# Altium schematic symbol library Regulator_Switching.SchLib: 1070 symbols (part 4 of 9)
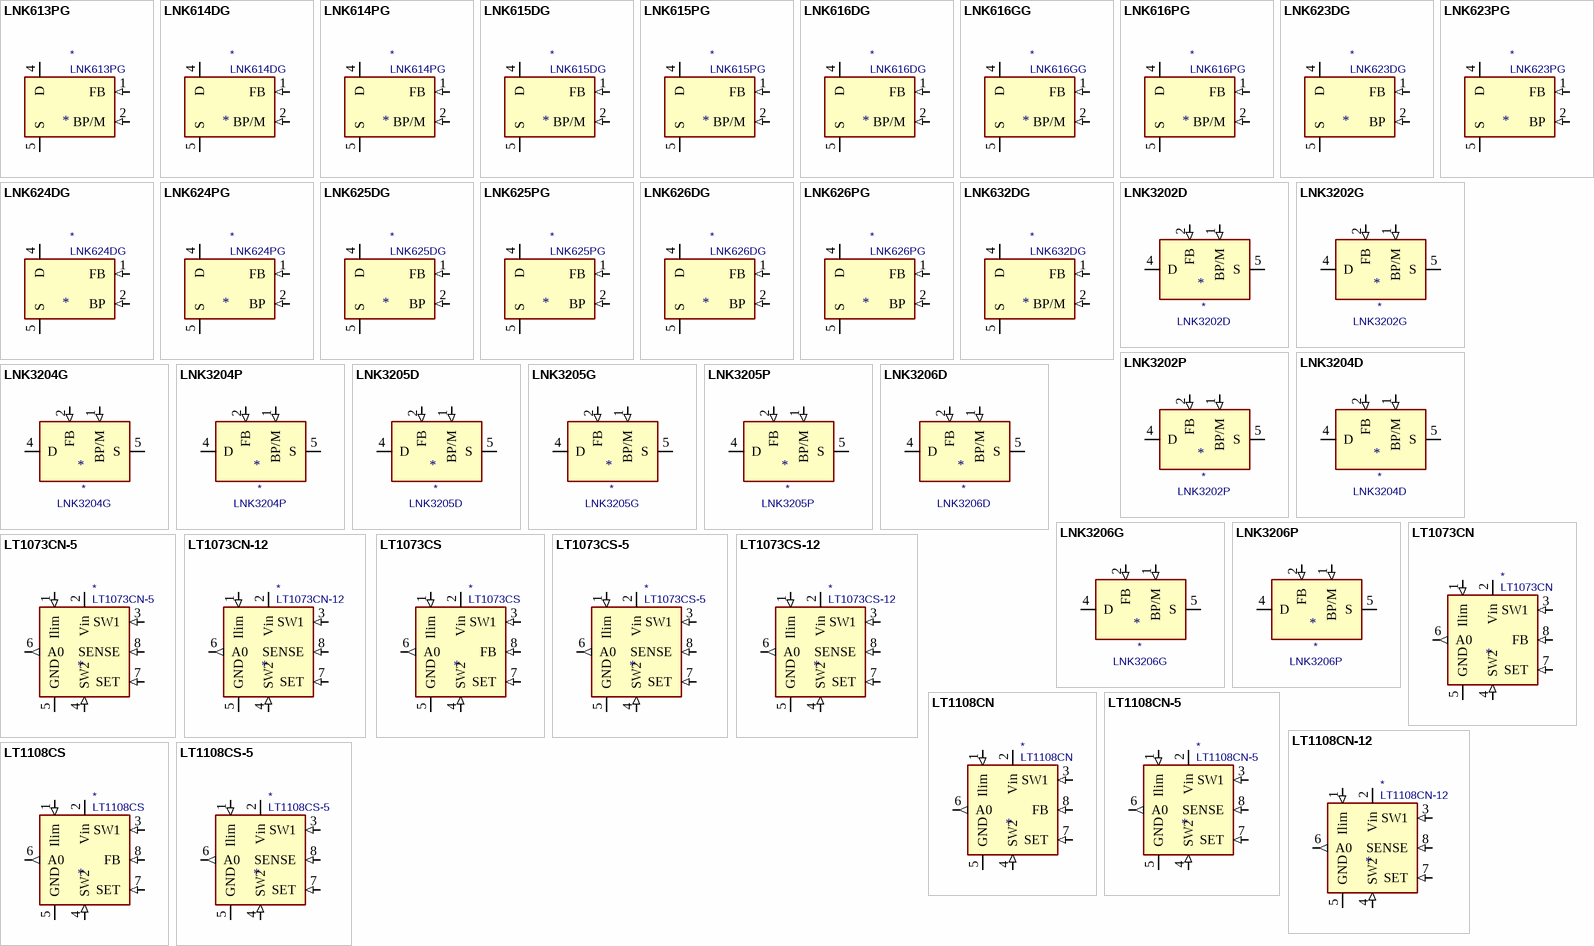
[diagram p29: symbols LNK613PG to LT1108CS-5]

## LNK626PG
designator *  value LNK626PG
ki_keywords: Energy-Efficient, Off-line Switcher with Accurate Primary-side Constant-Voltage Control; ki_description: LinkSwitch-CV Family, 10W Output Power, DIP-8C; ki_fp_filters: PowerIntegrations?PDIP?8C*; Footprint: Package_DIP:PowerIntegrations_PDIP-8C; Supplier: http://www.powerint.com/sites/default/files/product-docs/linkcv_family_datasheet.pdf
footprint PowerIntegrations_PDIP-8C
pins: 1 FB (in), 2 BP (in), 4 D (oc), 5 S (power), 6 S hidden, 7 S hidden, 8 S hidden

## LNK632DG
designator *  value LNK632DG
ki_keywords: Energy-Efficient, Accurate CV Switcher With CC Control for Adapters and Chargers; ki_description: LinkSwitch-II Family, 3.1W Output Power, SO-8C; ki_fp_filters: PowerIntegrations?SO?8C*; Footprint: Package_SO:PowerIntegrations_SO-8C; Supplier: http://www.powerint.com/sites/default/files/product-docs/linkswitch-ii_632DG_datasheet.pdf
footprint PowerIntegrations_SO-8C
pins: 1 FB (in), 2 BP/M (in), 4 D (oc), 5 S (power), 6 S hidden, 7 S hidden, 8 S hidden

## LNK3202D
designator *  value LNK3202D
ki_keywords: Lowest Component Count, Energy-Efficient Off-Line Switcher IC; ki_description: LinkSwitch-TN2 Family, 80mA Output Current, SO-8C; ki_fp_filters: PowerIntegrations?SO?8C*; Footprint: Package_SO:PowerIntegrations_SO-8C; Supplier: https://ac-dc.power.com/sites/default/files/product-docs/LinkSwitch-TN2_family_datasheet.pdf
footprint PowerIntegrations_SO-8C
pins: 1 BP/M (in), 2 FB (in), 4 D (oc), 5 S (power), 6 S hidden, 7 S hidden, 8 S hidden

## LNK3202G
designator *  value LNK3202G
ki_keywords: Lowest Component Count, Energy-Efficient Off-Line Switcher IC; ki_description: LinkSwitch-TN2 Family, 80mA Output Current, SMD-8C; ki_fp_filters: PowerIntegrations?SMD?8C*; Footprint: Package_DIP:PowerIntegrations_SMD-8C; Supplier: https://ac-dc.power.com/sites/default/files/product-docs/LinkSwitch-TN2_family_datasheet.pdf
footprint PowerIntegrations_SMD-8C
pins: 1 BP/M (in), 2 FB (in), 4 D (oc), 5 S (power), 6 S hidden, 7 S hidden, 8 S hidden

## LNK3202P
designator *  value LNK3202P
ki_keywords: Lowest Component Count, Energy-Efficient Off-Line Switcher IC; ki_description: LinkSwitch-TN2 Family, 80mA Output Current, DIP-8C; ki_fp_filters: PowerIntegrations?PDIP?8C*; Footprint: Package_DIP:PowerIntegrations_PDIP-8C; Supplier: https://ac-dc.power.com/sites/default/files/product-docs/LinkSwitch-TN2_family_datasheet.pdf
footprint PowerIntegrations_PDIP-8C
pins: 1 BP/M (in), 2 FB (in), 4 D (oc), 5 S (power), 6 S hidden, 7 S hidden, 8 S hidden

## LNK3204D
designator *  value LNK3204D
ki_keywords: Lowest Component Count, Energy-Efficient Off-Line Switcher IC; ki_description: LinkSwitch-TN2 Family, 170mA Output Current, SO-8C; ki_fp_filters: PowerIntegrations?SO?8C*; Footprint: Package_SO:PowerIntegrations_SO-8C; Supplier: https://ac-dc.power.com/sites/default/files/product-docs/LinkSwitch-TN2_family_datasheet.pdf
footprint PowerIntegrations_SO-8C
pins: 1 BP/M (in), 2 FB (in), 4 D (oc), 5 S (power), 6 S hidden, 7 S hidden, 8 S hidden

## LNK3204G
designator *  value LNK3204G
ki_keywords: Lowest Component Count, Energy-Efficient Off-Line Switcher IC; ki_description: LinkSwitch-TN2 Family, 170mA Output Current, SMD-8C; ki_fp_filters: PowerIntegrations?SMD?8C*; Footprint: Package_DIP:PowerIntegrations_SMD-8C; Supplier: https://ac-dc.power.com/sites/default/files/product-docs/LinkSwitch-TN2_family_datasheet.pdf
footprint PowerIntegrations_SMD-8C
pins: 1 BP/M (in), 2 FB (in), 4 D (oc), 5 S (power), 6 S hidden, 7 S hidden, 8 S hidden

## LNK3204P
designator *  value LNK3204P
ki_keywords: Lowest Component Count, Energy-Efficient Off-Line Switcher IC; ki_description: LinkSwitch-TN2 Family, 170mA Output Current, DIP-8C; ki_fp_filters: PowerIntegrations?PDIP?8C*; Footprint: Package_DIP:PowerIntegrations_PDIP-8C; Supplier: https://ac-dc.power.com/sites/default/files/product-docs/LinkSwitch-TN2_family_datasheet.pdf
footprint PowerIntegrations_PDIP-8C
pins: 1 BP/M (in), 2 FB (in), 4 D (oc), 5 S (power), 6 S hidden, 7 S hidden, 8 S hidden

## LNK3205D
designator *  value LNK3205D
ki_keywords: Lowest Component Count, Energy-Efficient Off-Line Switcher IC; ki_description: LinkSwitch-TN Family, 270mA Output Current, SO-8C; ki_fp_filters: PowerIntegrations?SO?8C*; Footprint: Package_SO:PowerIntegrations_SO-8C; Supplier: https://ac-dc.power.com/sites/default/files/product-docs/LinkSwitch-TN2_family_datasheet.pdf
footprint PowerIntegrations_SO-8C
pins: 1 BP/M (in), 2 FB (in), 4 D (oc), 5 S (power), 6 S hidden, 7 S hidden, 8 S hidden

## LNK3205G
designator *  value LNK3205G
ki_keywords: Lowest Component Count, Energy-Efficient Off-Line Switcher IC; ki_description: LinkSwitch-TN Family, 270mA Output Current, SMD-8C; ki_fp_filters: PowerIntegrations?SMD?8C*; Footprint: Package_DIP:PowerIntegrations_SMD-8C; Supplier: https://ac-dc.power.com/sites/default/files/product-docs/LinkSwitch-TN2_family_datasheet.pdf
footprint PowerIntegrations_SMD-8C
pins: 1 BP/M (in), 2 FB (in), 4 D (oc), 5 S (power), 6 S hidden, 7 S hidden, 8 S hidden

## LNK3205P
designator *  value LNK3205P
ki_keywords: Lowest Component Count, Energy-Efficient Off-Line Switcher IC; ki_description: LinkSwitch-TN Family, 270mA Output Current, DIP-8C; ki_fp_filters: PowerIntegrations?PDIP?8C*; Footprint: Package_DIP:PowerIntegrations_PDIP-8C; Supplier: https://ac-dc.power.com/sites/default/files/product-docs/LinkSwitch-TN2_family_datasheet.pdf
footprint PowerIntegrations_PDIP-8C
pins: 1 BP/M (in), 2 FB (in), 4 D (oc), 5 S (power), 6 S hidden, 7 S hidden, 8 S hidden

## LNK3206D
designator *  value LNK3206D
ki_keywords: Lowest Component Count, Energy-Efficient Off-Line Switcher IC; ki_description: LinkSwitch-TN2 Family, 360mA Output Current, SO-8C; ki_fp_filters: PowerIntegrations?SO?8C*; Footprint: Package_SO:PowerIntegrations_SO-8C; Supplier: https://ac-dc.power.com/sites/default/files/product-docs/LinkSwitch-TN2_family_datasheet.pdf
footprint PowerIntegrations_SO-8C
pins: 1 BP/M (in), 2 FB (in), 4 D (oc), 5 S (power), 6 S hidden, 7 S hidden, 8 S hidden

## LNK3206G
designator *  value LNK3206G
ki_keywords: Lowest Component Count, Energy-Efficient Off-Line Switcher IC; ki_description: LinkSwitch-TN2 Family, 360mA Output Current, SMD-8C; ki_fp_filters: PowerIntegrations?SMD?8C*; Footprint: Package_DIP:PowerIntegrations_SMD-8C; Supplier: https://ac-dc.power.com/sites/default/files/product-docs/LinkSwitch-TN2_family_datasheet.pdf
footprint PowerIntegrations_SMD-8C
pins: 1 BP/M (in), 2 FB (in), 4 D (oc), 5 S (power), 6 S hidden, 7 S hidden, 8 S hidden

## LNK3206P
designator *  value LNK3206P
ki_keywords: Lowest Component Count, Energy-Efficient Off-Line Switcher IC; ki_description: LinkSwitch-TN2 Family, 360mA Output Current, DIP-8B; ki_fp_filters: PowerIntegrations?PDIP?8C*; Footprint: Package_DIP:PowerIntegrations_PDIP-8C; Supplier: https://ac-dc.power.com/sites/default/files/product-docs/LinkSwitch-TN2_family_datasheet.pdf
footprint PowerIntegrations_PDIP-8C
pins: 1 BP/M (in), 2 FB (in), 4 D (oc), 5 S (power), 6 S hidden, 7 S hidden, 8 S hidden

## LT1073CN
designator *  value LT1073CN
ki_keywords: Micropower DC/DC Converter; ki_description: Micropower DC/DC Converter Adjustable Output Voltage, DIP-8; ki_fp_filters: DIP*W7.62mm*; Footprint: Package_DIP:DIP-8_W7.62mm; Supplier: https://www.analog.com/media/en/technical-documentation/data-sheets/1073fa.pdf
footprint DIP-8_W7.62mm
pins: 1 Ilim (in), 2 Vin (power), 3 SW1 (in), 4 SW2 (in), 5 GND (power), 6 A0 (out), 7 SET (in), 8 FB (in)

## LT1073CN-5
designator *  value LT1073CN-5
ki_keywords: Micropower DC/DC Converter; ki_description: Micropower DC/DC Converter, Fixed 5V Output Voltage, DIP-8; ki_fp_filters: DIP*W7.62mm*; Footprint: Package_DIP:DIP-8_W7.62mm; Supplier: https://www.analog.com/media/en/technical-documentation/data-sheets/1073fa.pdf
footprint DIP-8_W7.62mm
pins: 1 Ilim (in), 2 Vin (power), 3 SW1 (in), 4 SW2 (in), 5 GND (power), 6 A0 (out), 7 SET (in), 8 SENSE (in)

## LT1073CN-12
designator *  value LT1073CN-12
ki_keywords: Micropower DC/DC Converter; ki_description: Micropower DC/DC Converter, Fixed 12V Output Voltage, DIP-8; ki_fp_filters: DIP*W7.62mm*; Footprint: Package_DIP:DIP-8_W7.62mm; Supplier: https://www.analog.com/media/en/technical-documentation/data-sheets/1073fa.pdf
footprint DIP-8_W7.62mm
pins: 1 Ilim (in), 2 Vin (power), 3 SW1 (in), 4 SW2 (in), 5 GND (power), 6 A0 (out), 7 SET (in), 8 SENSE (in)

## LT1073CS
designator *  value LT1073CS
ki_keywords: Micropower DC/DC Converter; ki_description: Micropower DC/DC Converter Adjustable Output Voltage, SO-8; ki_fp_filters: SOIC*3.9x4.9mm*; Footprint: Package_SO:SOIC-8_3.9x4.9mm_P1.27mm; Supplier: https://www.analog.com/media/en/technical-documentation/data-sheets/1073fa.pdf
footprint SOIC-8_3.9x4.9mm_P1.27mm
pins: 1 Ilim (in), 2 Vin (power), 3 SW1 (in), 4 SW2 (in), 5 GND (power), 6 A0 (out), 7 SET (in), 8 FB (in)

## LT1073CS-5
designator *  value LT1073CS-5
ki_keywords: Micropower DC/DC Converter; ki_description: Micropower DC/DC Converter, Fixed 5V Output Voltage, SO-8; ki_fp_filters: SOIC*3.9x4.9mm*P1.27mm*; Footprint: Package_SO:SOIC-8_3.9x4.9mm_P1.27mm; Supplier: https://www.analog.com/media/en/technical-documentation/data-sheets/1073fa.pdf
footprint SOIC-8_3.9x4.9mm_P1.27mm
pins: 1 Ilim (in), 2 Vin (power), 3 SW1 (in), 4 SW2 (in), 5 GND (power), 6 A0 (out), 7 SET (in), 8 SENSE (in)

## LT1073CS-12
designator *  value LT1073CS-12
ki_keywords: Micropower DC/DC Converter; ki_description: Micropower DC/DC Converter, Fixed 12V Output Voltage, SO-8; ki_fp_filters: SOIC*3.9x4.9mm*P1.27mm*; Footprint: Package_SO:SOIC-8_3.9x4.9mm_P1.27mm; Supplier: https://www.analog.com/media/en/technical-documentation/data-sheets/1073fa.pdf
footprint SOIC-8_3.9x4.9mm_P1.27mm
pins: 1 Ilim (in), 2 Vin (power), 3 SW1 (in), 4 SW2 (in), 5 GND (power), 6 A0 (out), 7 SET (in), 8 SENSE (in)

## LT1108CN
designator *  value LT1108CN
ki_keywords: switching buck boost converter step-down step-up; ki_description: Micropower DC-DC converter, step-up or step-down operation, 2V-30Vin, adjustable output voltage, DIP-8; ki_fp_filters: DIP*W7.62mm*; Footprint: Package_DIP:DIP-8_W7.62mm; Supplier: https://www.analog.com/media/en/technical-documentation/data-sheets/lt1108.pdf
footprint DIP-8_W7.62mm
pins: 1 Ilim (in), 2 Vin (power), 3 SW1 (in), 4 SW2 (in), 5 GND (power), 6 A0 (out), 7 SET (in), 8 FB (in)

## LT1108CN-5
designator *  value LT1108CN-5
ki_keywords: switching buck boost converter step-down step-up; ki_description: Micropower DC-DC converter, step-up or step-down operation, 2V-30Vin, fixed 5V output voltage, DIP-8; ki_fp_filters: DIP*W7.62mm*; Footprint: Package_DIP:DIP-8_W7.62mm; Supplier: https://www.analog.com/media/en/technical-documentation/data-sheets/lt1108.pdf
footprint DIP-8_W7.62mm
pins: 1 Ilim (in), 2 Vin (power), 3 SW1 (in), 4 SW2 (in), 5 GND (power), 6 A0 (out), 7 SET (in), 8 SENSE (in)

## LT1108CN-12
designator *  value LT1108CN-12
ki_keywords: switching buck boost converter step-down step-up; ki_description: Micropower DC-DC converter, step-up or step-down operation, 2V-30Vin, fixed 12V output voltage, DIP-8; ki_fp_filters: DIP*W7.62mm*; Footprint: Package_DIP:DIP-8_W7.62mm; Supplier: https://www.analog.com/media/en/technical-documentation/data-sheets/lt1108.pdf
footprint DIP-8_W7.62mm
pins: 1 Ilim (in), 2 Vin (power), 3 SW1 (in), 4 SW2 (in), 5 GND (power), 6 A0 (out), 7 SET (in), 8 SENSE (in)

## LT1108CS
designator *  value LT1108CS
ki_keywords: switching buck boost converter step-down step-up; ki_description: Micropower DC-DC converter, step-up or step-down operation, 2V-30Vin, adjustable output voltage, SO-8; ki_fp_filters: SOIC*3.9x4.9mm*; Footprint: Package_SO:SOIC-8_3.9x4.9mm_P1.27mm; Supplier: https://www.analog.com/media/en/technical-documentation/data-sheets/lt1108.pdf
footprint SOIC-8_3.9x4.9mm_P1.27mm
pins: 1 Ilim (in), 2 Vin (power), 3 SW1 (in), 4 SW2 (in), 5 GND (power), 6 A0 (out), 7 SET (in), 8 FB (in)

## LT1108CS-5
designator *  value LT1108CS-5
ki_keywords: switching buck boost converter step-down step-up; ki_description: Micropower DC-DC converter, step-up or step-down operation, 2V-30Vin, fixed 5V output voltage, SO-8; ki_fp_filters: SOIC*3.9x4.9mm*P1.27mm*; Footprint: Package_SO:SOIC-8_3.9x4.9mm_P1.27mm; Supplier: https://www.analog.com/media/en/technical-documentation/data-sheets/lt1108.pdf
footprint SOIC-8_3.9x4.9mm_P1.27mm
pins: 1 Ilim (in), 2 Vin (power), 3 SW1 (in), 4 SW2 (in), 5 GND (power), 6 A0 (out), 7 SET (in), 8 SENSE (in)

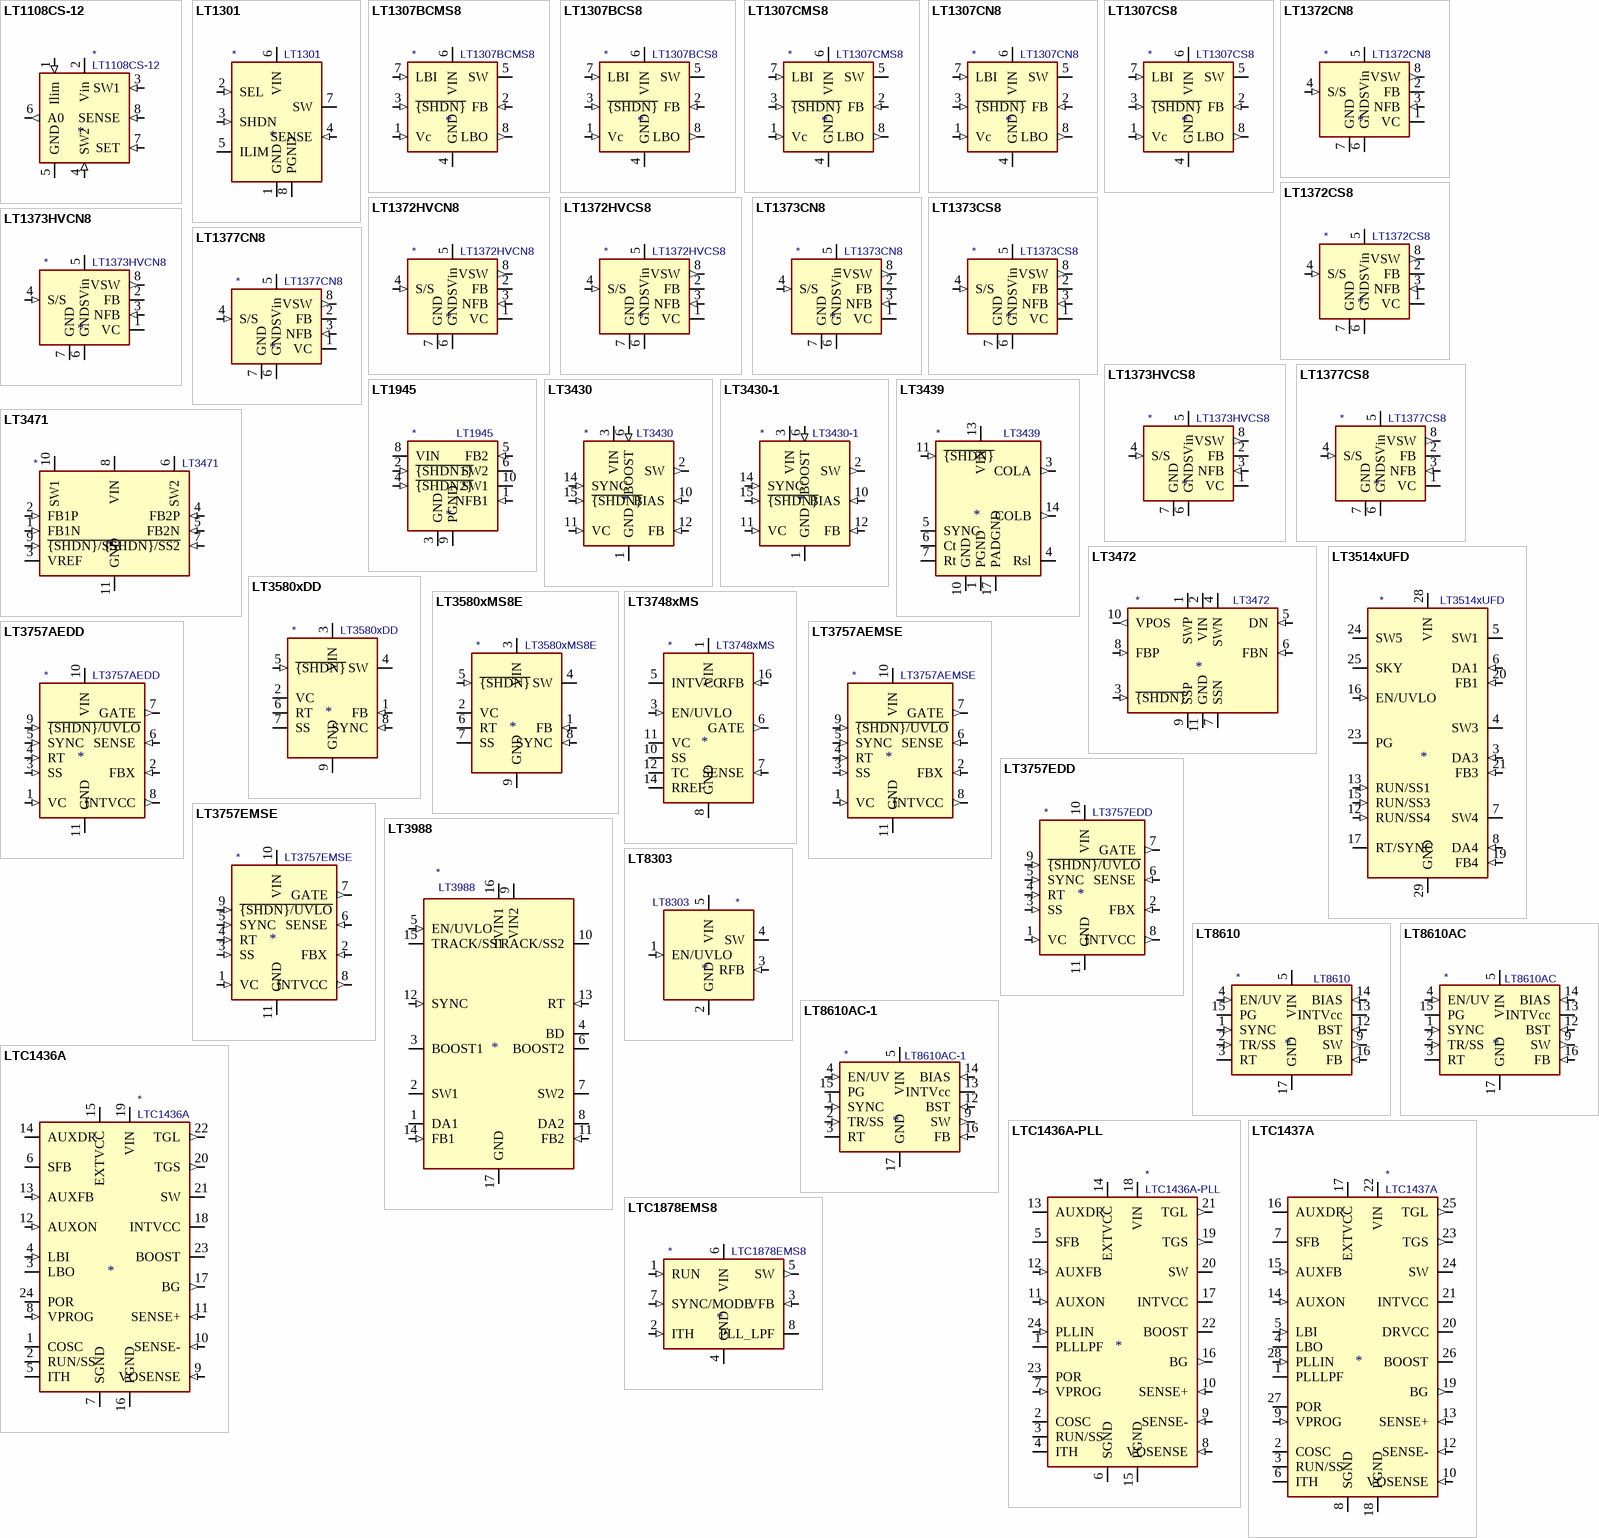
[diagram p11: symbols LT1108CS-12 to LTC1878EMS8]

## LT1108CS-12
designator *  value LT1108CS-12
ki_keywords: switching buck boost converter step-down step-up; ki_description: Micropower DC-DC converter, step-up or step-down operation, 2V-30Vin, fixed 12V output voltage, SO-8; ki_fp_filters: SOIC*3.9x4.9mm*P1.27mm*; Footprint: Package_SO:SOIC-8_3.9x4.9mm_P1.27mm; Supplier: https://www.analog.com/media/en/technical-documentation/data-sheets/lt1108.pdf
footprint SOIC-8_3.9x4.9mm_P1.27mm
pins: 1 Ilim (in), 2 Vin (power), 3 SW1 (in), 4 SW2 (in), 5 GND (power), 6 A0 (out), 7 SET (in), 8 SENSE (in)

## LT1301
designator *  value LT1301
ki_keywords: 5v 12v dc converter boost; ki_description: Micropower High Efficiency 5V/12V Step-Up DC/DC Converter for Flash Memory, DIP-8/SOIC-8; ki_fp_filters: DIP*7.62mm* SOIC*3.9x4.9mm*P1.27mm*; Supplier: https://www.analog.com/media/en/technical-documentation/data-sheets/lt1301.pdf
pins: 1 GND (power), 2 SEL (in), 3 SHDN (in), 4 SENSE (in), 5 ILIM, 6 VIN (power), 7 SW, 8 PGND (power)

## LT1307BCMS8
designator *  value LT1307BCMS8
ki_keywords: Micropower PWM DC/DC Converter; ki_description: Single Cell Micropower 600kHz PWM DC/DC Converter, 10µA Quiescent Current, MSOP-8; ki_fp_filters: MSOP*3x3mm*P0.5mm*; Footprint: Package_SO:MSOP-10_3x3mm_P0.5mm; Supplier: https://www.analog.com/media/en/technical-documentation/data-sheets/1307fa.pdf
footprint MSOP-10_3x3mm_P0.5mm
pins: 1 Vc (in), 2 FB (in), 3 ~{{SHDN}} (in), 4 GND (power), 5 SW (oc), 6 VIN (power), 7 LBI (in), 8 LBO (out)

## LT1307BCS8
designator *  value LT1307BCS8
ki_keywords: Micropower PWM DC/DC Converter; ki_description: Single Cell Micropower 600kHz PWM DC/DC Converter, 10µA Quiescent Current, SO-8; ki_fp_filters: SOIC*3.9x4.9mm*P1.27mm*; Footprint: Package_SO:SOIC-8_3.9x4.9mm_P1.27mm; Supplier: https://www.analog.com/media/en/technical-documentation/data-sheets/1307fa.pdf
footprint SOIC-8_3.9x4.9mm_P1.27mm
pins: 1 Vc (in), 2 FB (in), 3 ~{{SHDN}} (in), 4 GND (power), 5 SW (oc), 6 VIN (power), 7 LBI (in), 8 LBO (out)

## LT1307CMS8
designator *  value LT1307CMS8
ki_keywords: Micropower PWM DC/DC Converter; ki_description: Single Cell Micropower 600kHz PWM DC/DC Converter, 50µA Quiescent Current, MSOP-8; ki_fp_filters: MSOP*3x3mm*P0.5mm*; Footprint: Package_SO:MSOP-10_3x3mm_P0.5mm; Supplier: https://www.analog.com/media/en/technical-documentation/data-sheets/1307fa.pdf
footprint MSOP-10_3x3mm_P0.5mm
pins: 1 Vc (in), 2 FB (in), 3 ~{{SHDN}} (in), 4 GND (power), 5 SW (oc), 6 VIN (power), 7 LBI (in), 8 LBO (out)

## LT1307CN8
designator *  value LT1307CN8
ki_keywords: Micropower PWM DC/DC Converter; ki_description: Single Cell Micropower 600kHz PWM DC/DC Converter, 50µA Quiescent Current, DIP-8; ki_fp_filters: DIP*W7.62mm*; Footprint: Package_DIP:DIP-8_W7.62mm; Supplier: https://www.analog.com/media/en/technical-documentation/data-sheets/1307fa.pdf
footprint DIP-8_W7.62mm
pins: 1 Vc (in), 2 FB (in), 3 ~{{SHDN}} (in), 4 GND (power), 5 SW (oc), 6 VIN (power), 7 LBI (in), 8 LBO (out)

## LT1307CS8
designator *  value LT1307CS8
ki_keywords: Micropower PWM DC/DC Converter; ki_description: Single Cell Micropower 600kHz PWM DC/DC Converter, 50µA Quiescent Current, SO-8; ki_fp_filters: SOIC*3.9x4.9mm*P1.27mm*; Footprint: Package_SO:SOIC-8_3.9x4.9mm_P1.27mm; Supplier: https://www.analog.com/media/en/technical-documentation/data-sheets/1307fa.pdf
footprint SOIC-8_3.9x4.9mm_P1.27mm
pins: 1 Vc (in), 2 FB (in), 3 ~{{SHDN}} (in), 4 GND (power), 5 SW (oc), 6 VIN (power), 7 LBI (in), 8 LBO (out)

## LT1372CN8
designator *  value LT1372CN8
ki_keywords: Switching Regulator Adjustable; ki_description: 1.5A High Efficiency Switching Regulators, 500kHz, 35V Switch Voltage, Adjustable Output Voltage, DIP-8; ki_fp_filters: DIP*W7.62mm*; Footprint: Package_DIP:DIP-8_W7.62mm; Supplier: https://www.analog.com/media/en/technical-documentation/data-sheets/13727fbs.pdf
footprint DIP-8_W7.62mm
pins: 1 VC, 2 FB, 3 NFB (in), 4 S/S (in), 5 Vin (power), 6 GNDS (power), 7 GND (power), 8 VSW (out)

## LT1372CS8
designator *  value LT1372CS8
ki_keywords: Switching Regulator Adjustable; ki_description: 1.5A High Efficiency Switching Regulators, 500kHz, 35V Switch Voltage, Adjustable Output Voltage, SO-8; ki_fp_filters: SOIC*3.9x4.9mm*P1.27mm*; Footprint: Package_SO:SOIC-8_3.9x4.9mm_P1.27mm; Supplier: https://www.analog.com/media/en/technical-documentation/data-sheets/13727fbs.pdf
footprint SOIC-8_3.9x4.9mm_P1.27mm
pins: 1 VC, 2 FB, 3 NFB (in), 4 S/S (in), 5 Vin (power), 6 GNDS (power), 7 GND (power), 8 VSW (out)

## LT1372HVCN8
designator *  value LT1372HVCN8
ki_keywords: Switching Regulator Adjustable; ki_description: 1.5A High Efficiency Switching Regulators, 500kHz, 42V Switch Voltage, Adjustable Output Voltage, DIP-8; ki_fp_filters: DIP*W7.62mm*; Footprint: Package_DIP:DIP-8_W7.62mm; Supplier: https://www.analog.com/media/en/technical-documentation/data-sheets/13727fbs.pdf
footprint DIP-8_W7.62mm
pins: 1 VC, 2 FB, 3 NFB (in), 4 S/S (in), 5 Vin (power), 6 GNDS (power), 7 GND (power), 8 VSW (out)

## LT1372HVCS8
designator *  value LT1372HVCS8
ki_keywords: Switching Regulator Adjustable; ki_description: 1.5A High Efficiency Switching Regulators, 500kHz, 42V Switch Voltage, Adjustable Output Voltage, SO-8; ki_fp_filters: SOIC*3.9x4.9mm*P1.27mm*; Footprint: Package_SO:SOIC-8_3.9x4.9mm_P1.27mm; Supplier: https://www.analog.com/media/en/technical-documentation/data-sheets/13727fbs.pdf
footprint SOIC-8_3.9x4.9mm_P1.27mm
pins: 1 VC, 2 FB, 3 NFB (in), 4 S/S (in), 5 Vin (power), 6 GNDS (power), 7 GND (power), 8 VSW (out)

## LT1373CN8
designator *  value LT1373CN8
ki_keywords: Switching Regulator Adjustable; ki_description: 1.5A Low Supply Current High Efficiency Switching Regulators, 250kHz, 35V Switch Voltage, Adjustable Output Voltage, DIP-8; ki_fp_filters: DIP*W7.62mm*; Footprint: Package_DIP:DIP-8_W7.62mm; Supplier: https://www.analog.com/media/en/technical-documentation/data-sheets/1373fbs.pdf
footprint DIP-8_W7.62mm
pins: 1 VC, 2 FB, 3 NFB (in), 4 S/S (in), 5 Vin (power), 6 GNDS (power), 7 GND (power), 8 VSW (out)

## LT1373CS8
designator *  value LT1373CS8
ki_keywords: Switching Regulator Adjustable; ki_description: 1.5A Low Supply Current High Efficiency Switching Regulators, 250kHz, 35V Switch Voltage, Adjustable Output Voltage, SO-8; ki_fp_filters: SOIC*3.9x4.9mm*P1.27mm*; Footprint: Package_SO:SOIC-8_3.9x4.9mm_P1.27mm; Supplier: https://www.analog.com/media/en/technical-documentation/data-sheets/1373fbs.pdf
footprint SOIC-8_3.9x4.9mm_P1.27mm
pins: 1 VC, 2 FB, 3 NFB (in), 4 S/S (in), 5 Vin (power), 6 GNDS (power), 7 GND (power), 8 VSW (out)

## LT1373HVCN8
designator *  value LT1373HVCN8
ki_keywords: Switching Regulator Adjustable; ki_description: 1.5A Low Supply Current High Efficiency Switching Regulators, 250kHz, 42V Switch Voltage, Adjustable Output Voltage, DIP-8; ki_fp_filters: DIP*W7.62mm*; Footprint: Package_DIP:DIP-8_W7.62mm; Supplier: https://www.analog.com/media/en/technical-documentation/data-sheets/1373fbs.pdf
footprint DIP-8_W7.62mm
pins: 1 VC, 2 FB, 3 NFB (in), 4 S/S (in), 5 Vin (power), 6 GNDS (power), 7 GND (power), 8 VSW (out)

## LT1373HVCS8
designator *  value LT1373HVCS8
ki_keywords: Switching Regulator Adjustable; ki_description: 1.5A Low Supply Current High Efficiency Switching Regulators, 250kHz, 42V Switch Voltage, Adjustable Output Voltage, SO-8; ki_fp_filters: SOIC*3.9x4.9mm*P1.27mm*; Footprint: Package_SO:SOIC-8_3.9x4.9mm_P1.27mm; Supplier: https://www.analog.com/media/en/technical-documentation/data-sheets/1373fbs.pdf
footprint SOIC-8_3.9x4.9mm_P1.27mm
pins: 1 VC, 2 FB, 3 NFB (in), 4 S/S (in), 5 Vin (power), 6 GNDS (power), 7 GND (power), 8 VSW (out)

## LT1377CN8
designator *  value LT1377CN8
ki_keywords: Switching Regulator Adjustable; ki_description: 1.5A High Efficiency Switching Regulators, 1MHz, 35V Switch Voltage, Adjustable Output Voltage, DIP-8; ki_fp_filters: DIP*W7.62mm*; Footprint: Package_DIP:DIP-8_W7.62mm; Supplier: https://www.analog.com/media/en/technical-documentation/data-sheets/13727fbs.pdf
footprint DIP-8_W7.62mm
pins: 1 VC, 2 FB, 3 NFB (in), 4 S/S (in), 5 Vin (power), 6 GNDS (power), 7 GND (power), 8 VSW (out)

## LT1377CS8
designator *  value LT1377CS8
ki_keywords: Switching Regulator Adjustable; ki_description: 1.5A High Efficiency Switching Regulators, 1MHz, 35V Switch Voltage, Adjustable Output Voltage, SO-8; ki_fp_filters: SOIC*3.9x4.9mm*P1.27mm*; Footprint: Package_SO:SOIC-8_3.9x4.9mm_P1.27mm; Supplier: https://www.analog.com/media/en/technical-documentation/data-sheets/13727fbs.pdf
footprint SOIC-8_3.9x4.9mm_P1.27mm
pins: 1 VC, 2 FB, 3 NFB (in), 4 S/S (in), 5 Vin (power), 6 GNDS (power), 7 GND (power), 8 VSW (out)

## LT1945
designator *  value LT1945
ki_keywords: switched voltage converter regulator inverter double shutdown  positive negative; ki_description: Dual Micropower DC/DC Converter with Positive and Negative Outputs, MSOP-10; ki_fp_filters: MSOP*3x3mm*P0.5mm*; Footprint: Package_SO:MSOP-10_3x3mm_P0.5mm; Supplier: https://www.analog.com/media/en/technical-documentation/data-sheets/1945fa.pdf
footprint MSOP-10_3x3mm_P0.5mm
pins: 1 NFB1 (in), 2 ~{{SHDN1}} (in), 3 GND (power), 4 ~{{SHDN2}} (in), 5 FB2 (in), 6 SW2 (power), 7 PGND hidden, 8 VIN (power), 9 PGND (power), 10 SW1 (power)

## LT3430
designator *  value LT3430
ki_keywords: Step-Down Switching Regulator; ki_description: 3A High Voltage 200kHz Step-Down Switching Regulator, TSSOP-16; ki_fp_filters: TSSOP*EP*4.4x5mm*P0.65mm*; Footprint: Package_SO:TSSOP-14-1EP_4.4x5mm_P0.65mm; Supplier: https://www.analog.com/media/en/technical-documentation/data-sheets/34301fa.pdf
footprint TSSOP-14-1EP_4.4x5mm_P0.65mm
pins: 1 GND (power), 2 SW (out), 3 VIN (power), 4 VIN hidden, 5 SW hidden, 6 BOOST (in), 8 GND hidden, 9 GND hidden, 10 BIAS (in), 11 VC (in), 12 FB (in), 14 SYNC (in), 15 ~{{SHDN}} (in), 16 GND hidden, 17 GND hidden

## LT3430-1
designator *  value LT3430-1
ki_keywords: Step-Down Switching Regulator; ki_description: 3A High Voltage 100kHz Step-Down Switching Regulator, TSSOP-16; ki_fp_filters: TSSOP*EP*4.4x5mm*P0.65mm*; Footprint: Package_SO:TSSOP-14-1EP_4.4x5mm_P0.65mm; Supplier: https://www.analog.com/media/en/technical-documentation/data-sheets/34301fa.pdf
footprint TSSOP-14-1EP_4.4x5mm_P0.65mm
pins: 1 GND (power), 2 SW (out), 3 VIN (power), 4 VIN hidden, 5 SW hidden, 6 BOOST (in), 8 GND hidden, 9 GND hidden, 10 BIAS (in), 11 VC (in), 12 FB (in), 14 SYNC (in), 15 ~{{SHDN}} (in), 16 GND hidden, 17 GND hidden

## LT3439
designator *  value LT3439
ki_keywords: Isolated DC/DC Transformer Driver; ki_description: 1A Slew Rate Controlled Ultralow Noise Isolated DC/DC Transformer Driver, TSSOP-16; ki_fp_filters: TSSOP*EP*4.4x5mm*P0.65mm*; Footprint: Package_SO:TSSOP-16-1EP_4.4x5mm_P0.65mm; Supplier: https://www.analog.com/media/en/technical-documentation/data-sheets/3439fs.pdf
footprint TSSOP-16-1EP_4.4x5mm_P0.65mm
pins: 1 PGND (power), 2 NC (in) hidden, 3 COLA (out), 4 Rsl, 5 SYNC, 6 Ct, 7 Rt, 8 NC (in) hidden, 9 NC (in) hidden, 10 GND (power), 11 ~{{SHDN}} (in), 12 NC (in) hidden, 13 VIN (power), 14 COLB (out), 15 NC (in) hidden, 16 PGND hidden, 17 PADGND (power)

## LT3471
designator *  value LT3471
ki_keywords: dc/dc converter boost inverter; ki_description: Dual 1.3A, 1.2MHz Boost/Inverter, DFN-10; ki_fp_filters: DFN*1EP*3x3mm*P0.5mm*; Footprint: Package_DFN_QFN:DFN-10-1EP_3x3mm_P0.5mm_EP1.65x2.38mm; Supplier: https://www.analog.com/media/en/technical-documentation/data-sheets/3471fb.pdf
footprint DFN-10-1EP_3x3mm_P0.5mm_EP1.65x2.38mm
pins: 1 FB1N (in), 2 FB1P (in), 3 VREF (power), 4 FB2P (in), 5 FB2N (in), 6 SW2, 7 ~{{SHDN}/SS2} (in), 8 VIN (power), 9 ~{{SHDN}/SS1} (in), 10 SW1, 11 GND (power)

## LT3472
designator *  value LT3472
ki_keywords: DC/DC converter CCD Bias Boost; ki_description: Boost and Inverting DC/DC Converter for CCD Bias, DFN-10; ki_fp_filters: DFN*1EP*3x3mm*P0.5mm*; Footprint: Package_DFN_QFN:DFN-10-1EP_3x3mm_P0.5mm_EP1.65x2.38mm; Supplier: https://www.analog.com/media/en/technical-documentation/data-sheets/3472f.pdf
footprint DFN-10-1EP_3x3mm_P0.5mm_EP1.65x2.38mm
pins: 1 SWP (power), 2 VIN (power), 3 ~{{SHDN}} (in), 4 SWN (power), 5 DN (in), 6 FBN (in), 7 SSN (power), 8 FBP (in), 9 SSP (power), 10 VPOS (out), 11 GND (power)

## LT3514xUFD
designator *  value LT3514xUFD
ki_keywords: triple step-down; ki_description: Triple Step-Down Switching Regulator with 100% Duty Cycle Operation, QFN-28; ki_fp_filters: QFN*4x5mm*P0.5mm*; Footprint: Package_DFN_QFN:QFN-28-1EP_4x5mm_P0.5mm_EP2.65x3.65mm_ThermalVias; Supplier: https://www.analog.com/media/en/technical-documentation/data-sheets/3514fa.pdf
footprint QFN-28-1EP_4x5mm_P0.5mm_EP2.65x3.65mm_ThermalVias
pins: 1 NC (in) hidden, 2 NC (in) hidden, 3 DA3 (in), 4 SW3 (power), 5 SW1 (power), 6 DA1 (in), 7 SW4 (power), 8 DA4 (in), 9 VIN hidden, 10 GND hidden, 11 VIN hidden, 12 RUN/SS4 (in), 13 RUN/SS1 (in), 14 NC (in) hidden, 15 RUN/SS3 (in), 16 EN/UVLO (in), 17 RT/SYNC, 18 GND hidden, 19 FB4 (in), 20 FB1 (in), 21 FB3 (in), 22 NC (in) hidden, 23 PG (oc), 24 SW5 (oc), 25 SKY, 26 VIN hidden, 27 GND hidden, 28 VIN (power), 29 GND (power)

## LT3580xDD
designator *  value LT3580xDD
ki_keywords: boost inverting dc-dc; ki_description: Boost/Inverting DC/DC Converter with 2A Switch, Soft-Start, and Synchronization, DFN-8; ki_fp_filters: DFN*1EP*3x3mm*P0.5mm*; Footprint: Package_DFN_QFN:DFN-8-1EP_3x3mm_P0.5mm_EP1.66x2.38mm; Supplier: https://www.analog.com/media/en/technical-documentation/data-sheets/3580fg.pdf
footprint DFN-8-1EP_3x3mm_P0.5mm_EP1.66x2.38mm
pins: 1 FB (in), 2 VC, 3 VIN (power), 4 SW (oc), 5 ~{{SHDN}} (in), 6 RT, 7 SS, 8 SYNC (in), 9 GND (power)

## LT3580xMS8E
designator *  value LT3580xMS8E
ki_keywords: boost inverting dc-dc; ki_description: Boost/Inverting DC/DC Converter with 2A Switch, Soft-Start, and Synchronization, MSOP-8; ki_fp_filters: MSOP*1EP*3x3mm*P0.65mm*; Footprint: Package_SO:MSOP-8-1EP_3x3mm_P0.65mm_EP1.68x1.88mm; Supplier: https://www.analog.com/media/en/technical-documentation/data-sheets/3580fg.pdf
footprint MSOP-8-1EP_3x3mm_P0.65mm_EP1.68x1.88mm
pins: 1 FB (in), 2 VC, 3 VIN (power), 4 SW (oc), 5 ~{{SHDN}} (in), 6 RT, 7 SS, 8 SYNC (in), 9 GND (power)

## LT3748xMS
designator *  value LT3748xMS
ki_keywords: isolated flyback controller; ki_description: 100V Isolated Flyback Controller, MSOP-16; ki_fp_filters: Linear*MSOP*3x4mm*P0.5mm*; Footprint: Package_SO:Linear_MSOP-12-16_3x4mm_P0.5mm; Supplier: https://www.analog.com/media/en/technical-documentation/data-sheets/3748fb.pdf
footprint Linear_MSOP-12-16_3x4mm_P0.5mm
pins: 1 VIN (power), 3 EN/UVLO (in), 5 INTVCC, 6 GATE (out), 7 SENSE (in), 8 GND (power), 9 GND hidden, 10 SS, 11 VC, 12 TC, 14 RREF, 16 RFB (in)

## LT3757AEDD
designator *  value LT3757AEDD
ki_keywords: Boost flyback SEPIC inverting DC/DC regulator; ki_description: Boost, flyback, SEPIC and inverting regulator, improved load transient performance, DFN-10; ki_fp_filters: DFN*EP*3x3mm*P0.5mm*; Footprint: Package_DFN_QFN:DFN-10-1EP_3x3mm_P0.5mm_EP1.55x2.48mm; Supplier: https://www.analog.com/media/en/technical-documentation/data-sheets/3757Afe.pdf
footprint DFN-10-1EP_3x3mm_P0.5mm_EP1.55x2.48mm
pins: 1 VC (in), 2 FBX (in), 3 SS (in), 4 RT (in), 5 SYNC (in), 6 SENSE (in), 7 GATE (out), 8 INTVCC (out), 9 ~{{SHDN}/UVLO} (in), 10 VIN (power), 11 GND (power)

## LT3757AEMSE
designator *  value LT3757AEMSE
ki_keywords: Boost flyback SEPIC inverting DC/DC regulator; ki_description: Boost, flyback, SEPIC and inverting regulator, improved load transient performance, MSOP-10; ki_fp_filters: MSOP*EP*3x3mm*P0.5mm*; Footprint: Package_SO:MSOP-10-1EP_3x3mm_P0.5mm_EP1.68x1.88mm; Supplier: https://www.analog.com/media/en/technical-documentation/data-sheets/3757Afe.pdf
footprint MSOP-10-1EP_3x3mm_P0.5mm_EP1.68x1.88mm
pins: 1 VC (in), 2 FBX (in), 3 SS (in), 4 RT (in), 5 SYNC (in), 6 SENSE (in), 7 GATE (out), 8 INTVCC (out), 9 ~{{SHDN}/UVLO} (in), 10 VIN (power), 11 GND (power)

## LT3757EDD
designator *  value LT3757EDD
ki_keywords: Boost flyback SEPIC inverting DC/DC regulator; ki_description: Boost, flyback, SEPIC and inverting regulator. DFN-10; ki_fp_filters: DFN*EP*3x3mm*P0.5mm*; Footprint: Package_DFN_QFN:DFN-10-1EP_3x3mm_P0.5mm_EP1.55x2.48mm; Supplier: https://www.analog.com/media/en/technical-documentation/data-sheets/3757Afe.pdf
footprint DFN-10-1EP_3x3mm_P0.5mm_EP1.55x2.48mm
pins: 1 VC (in), 2 FBX (in), 3 SS (in), 4 RT (in), 5 SYNC (in), 6 SENSE (in), 7 GATE (out), 8 INTVCC (out), 9 ~{{SHDN}/UVLO} (in), 10 VIN (power), 11 GND (power)

## LT3757EMSE
designator *  value LT3757EMSE
ki_keywords: Boost flyback SEPIC inverting DC/DC regulator; ki_description: Boost, flyback, SEPIC and inverting regulator. MSOP-10; ki_fp_filters: MSOP*EP*3x3mm*P0.5mm*; Footprint: Package_SO:MSOP-10-1EP_3x3mm_P0.5mm_EP1.68x1.88mm; Supplier: https://www.analog.com/media/en/technical-documentation/data-sheets/3757Afe.pdf
footprint MSOP-10-1EP_3x3mm_P0.5mm_EP1.68x1.88mm
pins: 1 VC (in), 2 FBX (in), 3 SS (in), 4 RT (in), 5 SYNC (in), 6 SENSE (in), 7 GATE (out), 8 INTVCC (out), 9 ~{{SHDN}/UVLO} (in), 10 VIN (power), 11 GND (power)

## LT3988
designator *  value LT3988
ki_keywords: Dual 60V 1A Step-Down Switching Regulator; ki_description: Dual 1A Switching Buck Regulator with Internal Switches; ki_fp_filters: MSOP*16*1EP*3x4mm*P0.5mm*EP1.65x2.85mm*; Footprint: Package_SO:MSOP-16-1EP_3x4mm_P0.5mm_EP1.65x2.85mm; Supplier: https://www.analog.com/media/en/technical-documentation/data-sheets/3988f.pdf
footprint MSOP-16-1EP_3x4mm_P0.5mm_EP1.65x2.85mm
pins: 1 DA1, 2 SW1, 3 BOOST1, 4 BD (power), 5 EN/UVLO (in), 6 BOOST2, 7 SW2, 8 DA2, 9 VIN2 (power), 10 TRACK/SS2, 11 FB2 (in), 12 SYNC (in), 13 RT (in), 14 FB1 (in), 15 TRACK/SS1, 16 VIN1 (power), 17 GND (power)

## LT8303
designator *  value LT8303
ki_keywords: Flyback switcher; ki_description: 100VIN Micropower Isolated Flyback Converter with 150V/450mA Switch, TSOT-23-5; ki_fp_filters: TSOT?23*; Footprint: Package_TO_SOT_SMD:TSOT-23-5; Supplier: https://www.analog.com/media/en/technical-documentation/data-sheets/8303fa.pdf
footprint TSOT-23-5
pins: 1 EN/UVLO (in), 2 GND (power), 3 RFB (in), 4 SW (oc), 5 VIN (power)

## LT8610
designator *  value LT8610
ki_keywords: high efficiency speed synchronous monolithic buck step-down switching regulator 42V 2.5A; ki_description: 42V, 2.5A Synchronous Step-Down Regulator with 2.5uA Quiescent Current, MSOP-16; ki_fp_filters: LTC*MSOP*16*1EP*3x4mm*P0.5mm*EP2.15x3.26mm*; Footprint: Package_SO:LTC_MSOP-16-1EP_3x4mm_P0.5mm_EP2.15x3.26mm; Supplier: https://www.analog.com/media/en/technical-documentation/data-sheets/8610fa.pdf
footprint LTC_MSOP-16-1EP_3x4mm_P0.5mm_EP2.15x3.26mm
pins: 1 SYNC (in), 2 TR/SS (in), 3 RT, 4 EN/UV (in), 5 VIN (power), 6 VIN hidden, 7 GND hidden, 8 GND hidden, 9 SW (out), 10 SW hidden, 11 SW hidden, 12 BST (in), 13 INTVcc, 14 BIAS (in), 15 PG (oc), 16 FB (in), 17 GND (power)

## LT8610AC
designator *  value LT8610AC
ki_keywords: high efficiency speed synchronous monolithic buck step-down switching regulator 42V 3.5A lower feedback voltage minimum vin; ki_description: 42V, 3.5A Synchronous Step-Down Regulator with 2.5uA Quiescent Current, 0.8V Feedback Voltage, 3.0V Minimum Vin, MSOP-16; ki_fp_filters: LTC*MSOP*16*1EP*3x4mm*P0.5mm*EP2.15x3.26mm*; Footprint: Package_SO:LTC_MSOP-16-1EP_3x4mm_P0.5mm_EP2.15x3.26mm; Supplier: https://www.analog.com/media/en/technical-documentation/data-sheets/8610acfa.pdf
footprint LTC_MSOP-16-1EP_3x4mm_P0.5mm_EP2.15x3.26mm
pins: 1 SYNC (in), 2 TR/SS (in), 3 RT, 4 EN/UV (in), 5 VIN (power), 6 VIN hidden, 7 NC (in) hidden, 8 GND hidden, 9 SW (out), 10 SW hidden, 11 SW hidden, 12 BST (in), 13 INTVcc, 14 BIAS (in), 15 PG (oc), 16 FB (in), 17 GND (power)

## LT8610AC-1
designator *  value LT8610AC-1
ki_keywords: high efficiency speed synchronous monolithic buck step-down switching regulator 42V 3.5A lower feedback voltage minimum vin internal compensation soft-start; ki_description: 42V, 3.5A Synchronous Step-Down Regulator with 2.5uA Quiescent Current, Internal Compensation for Improved Transient, Soft-Start at Dropout and Brownout, MSOP-16; ki_fp_filters: LTC*MSOP*16*1EP*3x4mm*P0.5mm*EP2.15x3.26mm*; Footprint: Package_SO:LTC_MSOP-16-1EP_3x4mm_P0.5mm_EP2.15x3.26mm; Supplier: https://www.analog.com/media/en/technical-documentation/data-sheets/8610acfa.pdf
footprint LTC_MSOP-16-1EP_3x4mm_P0.5mm_EP2.15x3.26mm
pins: 1 SYNC (in), 2 TR/SS (in), 3 RT, 4 EN/UV (in), 5 VIN (power), 6 VIN hidden, 7 NC (in) hidden, 8 GND hidden, 9 SW (out), 10 SW hidden, 11 SW hidden, 12 BST (in), 13 INTVcc, 14 BIAS (in), 15 PG (oc), 16 FB (in), 17 GND (power)
